# Altium footprint library SMotlaq-PCB_lib.PcbLib: 186 footprints (part 7 of 12)
Each footprint in its own frame and in the unit in brackets; x right, y up, seen from the top. Pads: shape width x height; smd on the part's side, far side on the other; paste and mask are expansions set on the pad; w line width, h text height; cw(c..) or ccw(c..) is an arc to the next point about the centre after c.
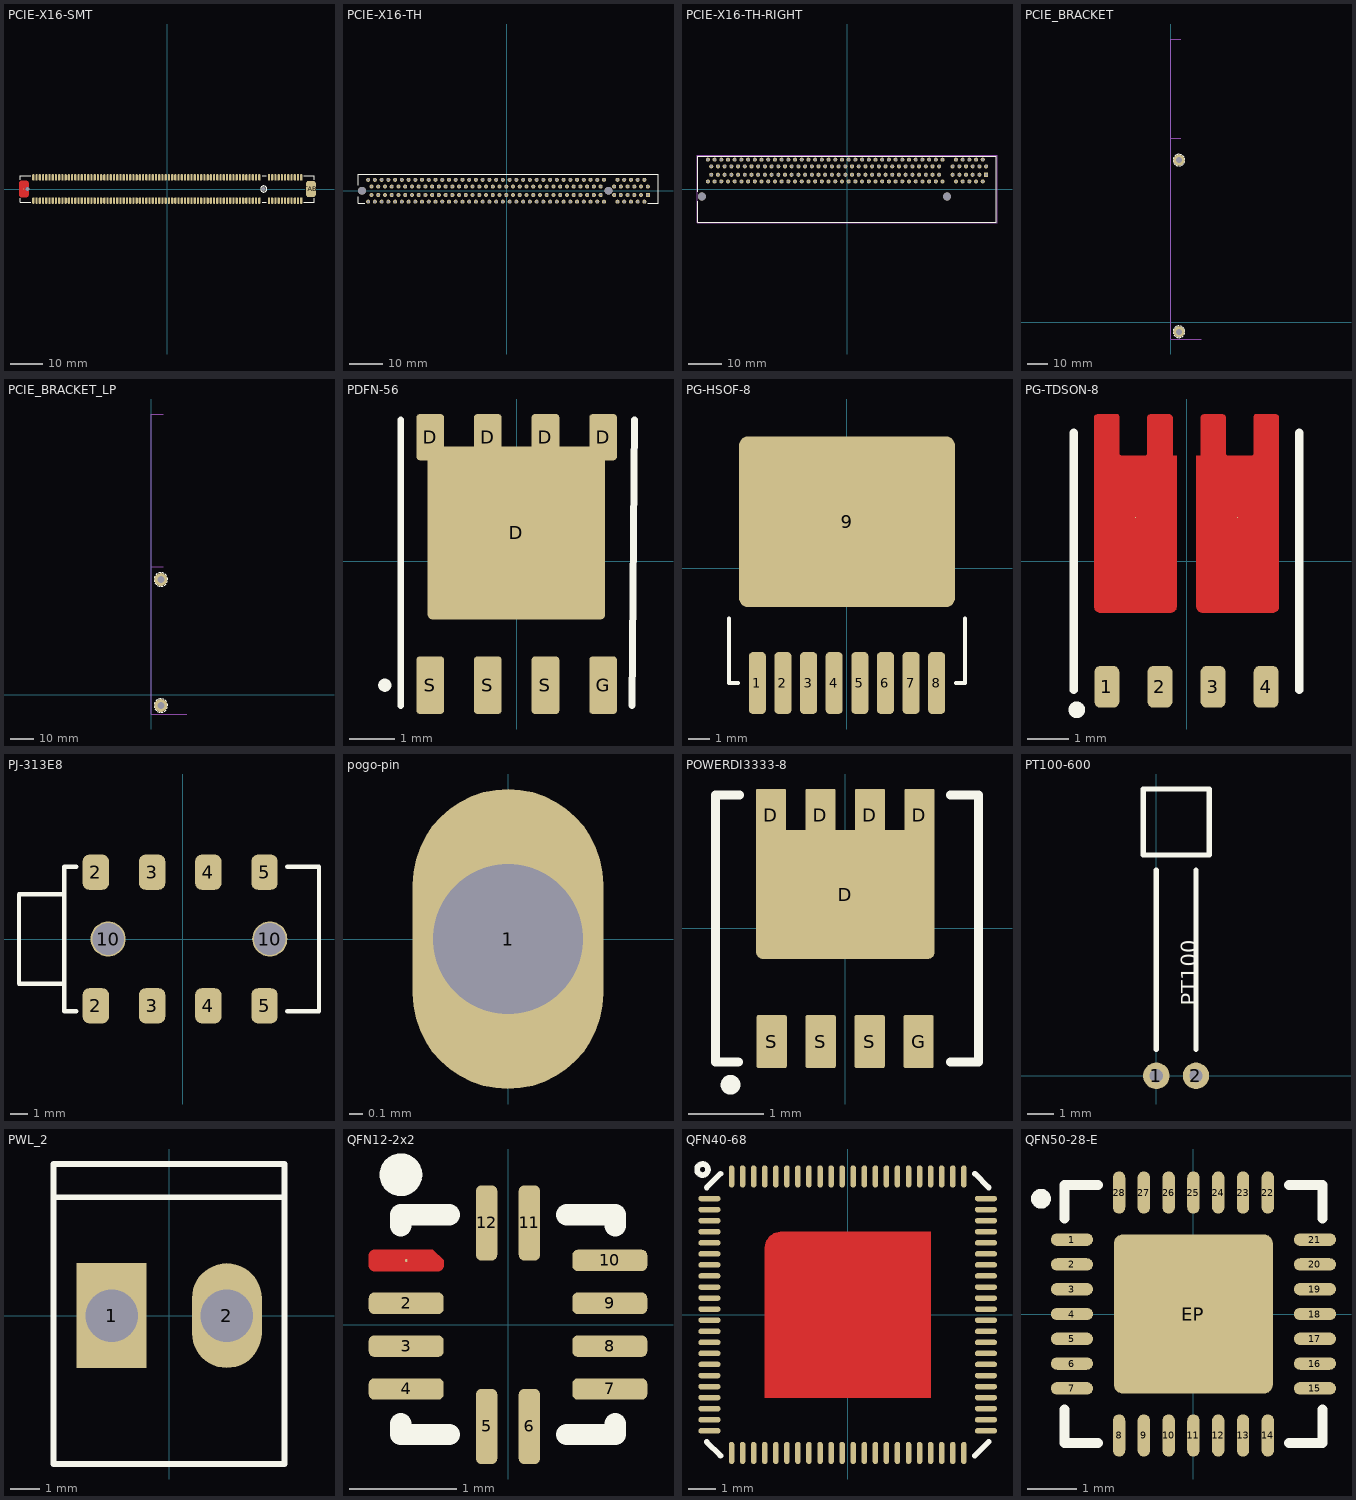
[diagram p6: the footprints below, top view; thin cyan lines are the x and y axes]

## PCIE-X16-SMT [mm]
pads (168):
  rrect80% 0.7x2 smd mask+0.075: A1(41.475,-3.6) A2(40.475,-3.6) A3(39.475,-3.6) A4(38.475,-3.6) A5(37.475,-3.6) A6(36.475,-3.6) A7(35.475,-3.6) A8(34.475,-3.6) A9(33.475,-3.6) A10(32.475,-3.6) A11(31.475,-3.6) A12(28.475,-3.6) A13(27.475,-3.6) A14(26.475,-3.6) A15(25.475,-3.6) A16(24.475,-3.6) A17(23.475,-3.6) A18(22.475,-3.6) A19(21.475,-3.6) A20(20.475,-3.6) A21(19.475,-3.6) A22(18.475,-3.6) A23(17.475,-3.6) A24(16.475,-3.6) A25(15.475,-3.6) A26(14.475,-3.6) A27(13.475,-3.6) A28(12.475,-3.6) A29(11.475,-3.6) A30(10.475,-3.6) A31(9.475,-3.6) A32(8.475,-3.6) A33(7.475,-3.6) A34(6.475,-3.6) A35(5.475,-3.6) A36(4.475,-3.6) A37(3.475,-3.6) A38(2.475,-3.6) A39(1.475,-3.6) A40(0.475,-3.6) A41(-0.525,-3.6) A42(-1.525,-3.6) A43(-2.525,-3.6) A44(-3.525,-3.6) A45(-4.525,-3.6) A46(-5.525,-3.6) A47(-6.525,-3.6) A48(-7.525,-3.6) A49(-8.525,-3.6) A50(-9.525,-3.6) A51(-10.525,-3.6) A52(-11.525,-3.6) A53(-12.525,-3.6) A54(-13.525,-3.6) A55(-14.525,-3.6) A56(-15.525,-3.6) A57(-16.525,-3.6) A58(-17.525,-3.6) A59(-18.525,-3.6) A60(-19.525,-3.6) A61(-20.525,-3.6) A62(-21.525,-3.6) A63(-22.525,-3.6) A64(-23.525,-3.6) A65(-24.525,-3.6) A66(-25.525,-3.6) A67(-26.525,-3.6) A68(-27.525,-3.6) A69(-28.525,-3.6) A70(-29.525,-3.6) A71(-30.525,-3.6) A72(-31.525,-3.6) A73(-32.525,-3.6) A74(-33.525,-3.6) A75(-34.525,-3.6) A76(-35.525,-3.6) A77(-36.525,-3.6) A78(-37.525,-3.6) A79(-38.525,-3.6) A80(-39.525,-3.6) A81(-40.525,-3.6) A82(-41.525,-3.6) B1(41.475,3.6) B2(40.475,3.6) B3(39.475,3.6) B4(38.475,3.6) B5(37.475,3.6) B6(36.475,3.6) B7(35.475,3.6) B8(34.475,3.6) B9(33.475,3.6) B10(32.475,3.6) B11(31.475,3.6) B12(28.475,3.6) B13(27.475,3.6) B14(26.475,3.6) B15(25.475,3.6) B16(24.475,3.6) B17(23.475,3.6) B18(22.475,3.6) B19(21.475,3.6) B20(20.475,3.6) B21(19.475,3.6) B22(18.475,3.6) B23(17.475,3.6) B24(16.475,3.6) B25(15.475,3.6) B26(14.475,3.6) B27(13.475,3.6) B28(12.475,3.6) B29(11.475,3.6) B30(10.475,3.6) B31(9.475,3.6) B32(8.475,3.6) B33(7.475,3.6) B34(6.475,3.6) B35(5.475,3.6) B36(4.475,3.6) B37(3.475,3.6) B38(2.475,3.6) B39(1.475,3.6) B40(0.475,3.6) B41(-0.525,3.6) B42(-1.525,3.6) B43(-2.525,3.6) B44(-3.525,3.6) B45(-4.525,3.6) B46(-5.525,3.6) B47(-6.525,3.6) B48(-7.525,3.6) B49(-8.525,3.6) B50(-9.525,3.6) B51(-10.525,3.6) B52(-11.525,3.6) B53(-12.525,3.6) B54(-13.525,3.6) B55(-14.525,3.6) B56(-15.525,3.6) B57(-16.525,3.6) B58(-17.525,3.6) B59(-18.525,3.6) B60(-19.525,3.6) B61(-20.525,3.6) B62(-21.525,3.6) B63(-22.525,3.6) B64(-23.525,3.6) B65(-24.525,3.6) B66(-25.525,3.6) B67(-26.525,3.6) B68(-27.525,3.6) B69(-28.525,3.6) B70(-29.525,3.6) B71(-30.525,3.6) B72(-31.525,3.6) B73(-32.525,3.6) B74(-33.525,3.6) B75(-34.525,3.6) B76(-35.525,3.6) B77(-36.525,3.6) B78(-37.525,3.6) B79(-38.525,3.6) B80(-39.525,3.6) B81(-40.525,3.6) B82(-41.525,3.6)
  rrect100% 0x0 hole 1.2 unplated mask+0.075: PIN(-43.325,0) PIN(29.825,0)
  round 0.025 smd mask+0.075: TAB(-44.475,0)
  rrect50% 3x5 smd mask+0.075: TAB(44.475,0)
Top Layer:
  region: -45.975,1.75 -45.975,-1.75 -45.975,-1.799 -45.962,-1.897 -45.937,-1.992 -45.899,-2.082 -45.85,-2.168 -45.79,-2.246 -45.721,-2.315 -45.643,-2.375 -45.557,-2.424 -45.467,-2.462 -45.372,-2.487 -45.274,-2.5 -45.225,-2.5 -43.725,-2.5 -43.676,-2.5 -43.578,-2.487 -43.483,-2.462 -43.393,-2.424 -43.307,-2.375 -43.229,-2.315 -43.16,-2.246 -43.1,-2.168 -43.051,-2.082 -43.013,-1.992 -42.988,-1.897 -42.975,-1.799 -42.975,-1.75 -42.975,-0.725 -43.375,-0.725 -43.419,-0.724 -43.507,-0.712 -43.592,-0.689 -43.674,-0.655 -43.75,-0.611 -43.82,-0.557 -43.882,-0.495 -43.936,-0.425 -43.98,-0.349 -44.014,-0.267 -44.037,-0.182 -44.049,-0.094 -44.05,-0.05 -44.05,0.025 -44.048,0.071 -44.037,0.162 -44.013,0.25 -43.978,0.335 -43.932,0.414 -43.876,0.487 -43.812,0.551 -43.739,0.607 -43.66,0.653 -43.575,0.688 -43.487,0.712 -43.396,0.723 -43.35,0.725 -42.975,0.725 -42.975,1.75 -42.975,1.799 -42.988,1.897 -43.013,1.992 -43.051,2.082 -43.1,2.168 -43.16,2.246 -43.229,2.315 -43.307,2.375 -43.393,2.424 -43.483,2.462 -43.578,2.487 -43.676,2.5 -43.725,2.5 -44.375,2.5 -45.225,2.5 -45.274,2.5 -45.372,2.487 -45.467,2.462 -45.557,2.424 -45.643,2.375 -45.721,2.315 -45.79,2.246 -45.85,2.168 -45.899,2.082 -45.937,1.992 -45.962,1.897 -45.975,1.799
Top Overlay:
  circle w0.2: c29.825,0 r0.941
  lines w0.2: -45.55,-2.85 -45.55,-4.1 -42.375,-4.1 ; -45.55,2.85 -45.55,4.1 -42.375,4.1 ; 29.325,-4.1 30.575,-4.1 ; 29.325,4.1 30.575,4.1 ; 42.325,-4.1 45.5,-4.1 45.5,-2.85 ; 42.325,4.1 45.5,4.1 45.5,2.85
3D body "User Library-G630HAA2621EU.STEP": height 10.91, standoff -0.69, extent -45.499,-4.475 45.5,4.475

## PCIE-X16-TH [mm]
pads (166):
  rect 1.208x1.208 hole 0.7: A1(41.8,-1.25)
  round 1.208 hole 0.7: A2(40.8,-3.25) A3(39.8,-1.25) A4(38.8,-3.25) A5(37.8,-1.25) A6(36.8,-3.25) A7(35.8,-1.25) A8(34.8,-3.25) A9(33.8,-1.25) A10(32.8,-3.25) A11(31.8,-1.25) A12(28.8,-3.25) A13(27.8,-1.25) A14(26.8,-3.25) A15(25.8,-1.25) A16(24.8,-3.25) A17(23.8,-1.25) A18(22.8,-3.25) A19(21.8,-1.25) A20(20.8,-3.25) A21(19.8,-1.25) A22(18.8,-3.25) A23(17.8,-1.25) A24(16.8,-3.25) A25(15.8,-1.25) A26(14.8,-3.25) A27(13.8,-1.25) A28(12.8,-3.25) A29(11.8,-1.25) A30(10.8,-3.25) A31(9.8,-1.25) A32(8.8,-3.25) A33(7.8,-1.25) A34(6.8,-3.25) A35(5.8,-1.25) A36(4.8,-3.25) A37(3.8,-1.25) A38(2.8,-3.25) A39(1.8,-1.25) A40(0.8,-3.25) A41(-0.2,-1.25) A42(-1.2,-3.25) A43(-2.2,-1.25) A44(-3.2,-3.25) A45(-4.2,-1.25) A46(-5.2,-3.25) A47(-6.2,-1.25) A48(-7.2,-3.25) A49(-8.2,-1.25) A50(-9.2,-3.25) A51(-10.2,-1.25) A52(-11.2,-3.25) A53(-12.2,-1.25) A54(-13.2,-3.25) A55(-14.2,-1.25) A56(-15.2,-3.25) A57(-16.2,-1.25) A58(-17.2,-3.25) A59(-18.2,-1.25) A60(-19.2,-3.25) A61(-20.2,-1.25) A62(-21.2,-3.25) A63(-22.2,-1.25) A64(-23.2,-3.25) A65(-24.2,-1.25) A66(-25.2,-3.25) A67(-26.2,-1.25) A68(-27.2,-3.25) A69(-28.2,-1.25) A70(-29.2,-3.25) A71(-30.2,-1.25) A72(-31.2,-3.25) A73(-32.2,-1.25) A74(-33.2,-3.25) A75(-34.2,-1.25) A76(-35.2,-3.25) A77(-36.2,-1.25) A78(-37.2,-3.25) A79(-38.2,-1.25) A80(-39.2,-3.25) A81(-40.2,-1.25) A82(-41.2,-3.25) B1(41.8,1.25) B2(40.8,3.25) B3(39.8,1.25) B4(38.8,3.25) B5(37.8,1.25) B6(36.8,3.25) B7(35.8,1.25) B8(34.8,3.25) B9(33.8,1.25) B10(32.8,3.25) B11(31.8,1.25) B12(28.8,3.25) B13(27.8,1.25) B14(26.8,3.25) B15(25.8,1.25) B16(24.8,3.25) B17(23.8,1.25) B18(22.8,3.25) B19(21.8,1.25) B20(20.8,3.25) B21(19.8,1.25) B22(18.8,3.25) B23(17.8,1.25) B24(16.8,3.25) B25(15.8,1.25) B26(14.8,3.25) B27(13.8,1.25) B28(12.8,3.25) B29(11.8,1.25) B30(10.8,3.25) B31(9.8,1.25) B32(8.8,3.25) B33(7.8,1.25) B34(6.8,3.25) B35(5.8,1.25) B36(4.8,3.25) B37(3.8,1.25) B38(2.8,3.25) B39(1.8,1.25) B40(0.8,3.25) B41(-0.2,1.25) B42(-1.2,3.25) B43(-2.2,1.25) B44(-3.2,3.25) B45(-4.2,1.25) B46(-5.2,3.25) B47(-6.2,1.25) B48(-7.2,3.25) B49(-8.2,1.25) B50(-9.2,3.25) B51(-10.2,1.25) B52(-11.2,3.25) B53(-12.2,1.25) B54(-13.2,3.25) B55(-14.2,1.25) B56(-15.2,3.25) B57(-16.2,1.25) B58(-17.2,3.25) B59(-18.2,1.25) B60(-19.2,3.25) B61(-20.2,1.25) B62(-21.2,3.25) B63(-22.2,1.25) B64(-23.2,3.25) B65(-24.2,1.25) B66(-25.2,3.25) B67(-26.2,1.25) B68(-27.2,3.25) B69(-28.2,1.25) B70(-29.2,3.25) B71(-30.2,1.25) B72(-31.2,3.25) B73(-32.2,1.25) B74(-33.2,3.25) B75(-34.2,1.25) B76(-35.2,3.25) B77(-36.2,1.25) B78(-37.2,3.25) B79(-38.2,1.25) B80(-39.2,3.25) B81(-40.2,1.25) B82(-41.2,3.25)
  round 2.35 hole 2.35 unplated: ""(-43,0) ""(30.15,0)
Top Overlay:
  lines w0.2: -44.2,-1.8 -44.2,-3.71 -42.25,-3.71 ; -44.2,1.6 -44.2,4.9 44.825,4.9 44.825,-3.71 41.85,-3.71
3D body "pcie-164-02-f-d-th.stp": height 10.2, standoff -5.38, extent -44.202,-3.708 44.8,4.902

## PCIE-X16-TH-RIGHT [mm]
pads (166):
  rect 1.208x1.208 hole 0.7: A1(41.5,4.25)
  round 1.208 hole 0.7: A2(40.5,2.25) A3(39.5,4.25) A4(38.5,2.25) A5(37.5,4.25) A6(36.5,2.25) A7(35.5,4.25) A8(34.5,2.25) A9(33.5,4.25) A10(32.5,2.25) A11(31.5,4.25) A12(28.5,2.25) A13(27.5,4.25) A14(26.5,2.25) A15(25.5,4.25) A16(24.5,2.25) A17(23.5,4.25) A18(22.5,2.25) A19(21.5,4.25) A20(20.5,2.25) A21(19.5,4.25) A22(18.5,2.25) A23(17.5,4.25) A24(16.5,2.25) A25(15.5,4.25) A26(14.5,2.25) A27(13.5,4.25) A28(12.5,2.25) A29(11.5,4.25) A30(10.5,2.25) A31(9.5,4.25) A32(8.5,2.25) A33(7.5,4.25) A34(6.5,2.25) A35(5.5,4.25) A36(4.5,2.25) A37(3.5,4.25) A38(2.5,2.25) A39(1.5,4.25) A40(0.5,2.25) A41(-0.5,4.25) A42(-1.5,2.25) A43(-2.5,4.25) A44(-3.5,2.25) A45(-4.5,4.25) A46(-5.5,2.25) A47(-6.5,4.25) A48(-7.5,2.25) A49(-8.5,4.25) A50(-9.5,2.25) A51(-10.5,4.25) A52(-11.5,2.25) A53(-12.5,4.25) A54(-13.5,2.25) A55(-14.5,4.25) A56(-15.5,2.25) A57(-16.5,4.25) A58(-17.5,2.25) A59(-18.5,4.25) A60(-19.5,2.25) A61(-20.5,4.25) A62(-21.5,2.25) A63(-22.5,4.25) A64(-23.5,2.25) A65(-24.5,4.25) A66(-25.5,2.25) A67(-26.5,4.25) A68(-27.5,2.25) A69(-28.5,4.25) A70(-29.5,2.25) A71(-30.5,4.25) A72(-31.5,2.25) A73(-32.5,4.25) A74(-33.5,2.25) A75(-34.5,4.25) A76(-35.5,2.25) A77(-36.5,4.25) A78(-37.5,2.25) A79(-38.5,4.25) A80(-39.5,2.25) A81(-40.5,4.25) A82(-41.5,2.25) B1(41.5,6.75) B2(40.5,8.75) B3(39.5,6.75) B4(38.5,8.75) B5(37.5,6.75) B6(36.5,8.75) B7(35.5,6.75) B8(34.5,8.75) B9(33.5,6.75) B10(32.5,8.75) B11(31.5,6.75) B12(28.5,8.75) B13(27.5,6.75) B14(26.5,8.75) B15(25.5,6.75) B16(24.5,8.75) B17(23.5,6.75) B18(22.5,8.75) B19(21.5,6.75) B20(20.5,8.75) B21(19.5,6.75) B22(18.5,8.75) B23(17.5,6.75) B24(16.5,8.75) B25(15.5,6.75) B26(14.5,8.75) B27(13.5,6.75) B28(12.5,8.75) B29(11.5,6.75) B30(10.5,8.75) B31(9.5,6.75) B32(8.5,8.75) B33(7.5,6.75) B34(6.5,8.75) B35(5.5,6.75) B36(4.5,8.75) B37(3.5,6.75) B38(2.5,8.75) B39(1.5,6.75) B40(0.5,8.75) B41(-0.5,6.75) B42(-1.5,8.75) B43(-2.5,6.75) B44(-3.5,8.75) B45(-4.5,6.75) B46(-5.5,8.75) B47(-6.5,6.75) B48(-7.5,8.75) B49(-8.5,6.75) B50(-9.5,8.75) B51(-10.5,6.75) B52(-11.5,8.75) B53(-12.5,6.75) B54(-13.5,8.75) B55(-14.5,6.75) B56(-15.5,8.75) B57(-16.5,6.75) B58(-17.5,8.75) B59(-18.5,6.75) B60(-19.5,8.75) B61(-20.5,6.75) B62(-21.5,8.75) B63(-22.5,6.75) B64(-23.5,8.75) B65(-24.5,6.75) B66(-25.5,8.75) B67(-26.5,6.75) B68(-27.5,8.75) B69(-28.5,6.75) B70(-29.5,8.75) B71(-30.5,6.75) B72(-31.5,8.75) B73(-32.5,6.75) B74(-33.5,8.75) B75(-34.5,6.75) B76(-35.5,8.75) B77(-36.5,6.75) B78(-37.5,8.75) B79(-38.5,6.75) B80(-39.5,8.75) B81(-40.5,6.75) B82(-41.5,8.75)
  round 2.35 hole 2.35 unplated: ""(-43.3,-2.25) ""(29.85,-2.25)
Top Overlay:
  lines w0.2: -44.5,-3.65 -44.5,-9.95 44.5,-9.95 44.5,9.8 -44.5,9.8 -44.5,-0.75
Mechanical 15:
  lines w0.05: -44.75,-10.05 -44.75,10.05 44.75,10.05 44.75,-10.05 -44.75,-10.05
3D body "pcie-164-02-f-d-ra.stp": height 9.45, standoff -4.4, extent -44.5,-9.975 44.5,9.075

## PCIE_BRACKET [mm] "PC IO BOARD BRACKET"
pads (2):
  round 5.5 hole 3: MH1(4,-4.7)
  round 5.5 hole 3 mask+0.075: MH2(4,80.7)
Top Overlay:
  lines w0.2: 1.1,-4.7 ccw(c4,-4.7) 1.275,-5.692 ; 1.1,80.7 ccw(c4,80.7) 1.275,79.708 ; 1.144,-4.196 cw(c4,-4.7) 1.489,-3.25 ; 1.144,81.204 cw(c4,80.7) 1.489,82.15 ; 1.489,-6.15 ccw(c4,-4.7) 2.136,-6.922 ; 1.489,79.25 ccw(c4,80.7) 2.136,78.478 ; 1.778,-2.836 cw(c4,-4.7) 2.55,-2.189 ; 1.778,82.564 cw(c4,80.7) 2.55,83.211 ; 2.55,-7.211 ccw(c4,-4.7) 3.496,-7.556 ; 2.55,78.189 ccw(c4,80.7) 3.496,77.844 ; 3.008,-1.975 cw(c4,-4.7) 4,-1.8 ; 3.008,83.425 cw(c4,80.7) 4,83.6 ; 4,-7.6 ccw(c4,-4.7) 4.992,-7.425 ; 4,77.8 ccw(c4,80.7) 4.992,77.975 ; 4.504,-1.844 cw(c4,-4.7) 5.45,-2.189 ; 4.504,83.556 cw(c4,80.7) 5.45,83.211 ; 5.45,-7.211 ccw(c4,-4.7) 6.222,-6.564 ; 5.45,78.189 ccw(c4,80.7) 6.222,78.836 ; 5.864,-2.478 cw(c4,-4.7) 6.511,-3.25 ; 5.864,82.922 cw(c4,80.7) 6.511,82.15 ; 6.511,-6.15 ccw(c4,-4.7) 6.856,-5.204 ; 6.511,79.25 ccw(c4,80.7) 6.856,80.196 ; 6.725,-3.708 cw(c4,-4.7) 6.9,-4.7 ; 6.725,81.692 cw(c4,80.7) 6.9,80.7
Mechanical 1:
  lines w0.1: 0,91.7 5,91.7 ; 5,141 0,141 0,-8.3 15,-8.3
3D body "User Library-pci bracket-1.step": height 16.91, standoff -4.68, extent -16.852,-29.305 7.151,91.705

## PCIE_BRACKET_LP [mm] "PC IO BOARD BRACKET"
pads (2):
  round 5.5 hole 3: MH1(4,-4.7) MH2(4,49.2)
Top Overlay:
  lines w0.2: 1.1,-4.7 ccw(c4,-4.7) 1.275,-5.692 ; 1.1,49.2 ccw(c4,49.2) 1.275,48.208 ; 1.144,-4.196 cw(c4,-4.7) 1.489,-3.25 ; 1.144,49.704 cw(c4,49.2) 1.489,50.65 ; 1.489,-6.15 ccw(c4,-4.7) 2.136,-6.922 ; 1.489,47.75 ccw(c4,49.2) 2.136,46.978 ; 1.778,-2.836 cw(c4,-4.7) 2.55,-2.189 ; 1.778,51.064 cw(c4,49.2) 2.55,51.711 ; 2.55,-7.211 ccw(c4,-4.7) 3.496,-7.556 ; 2.55,46.688 ccw(c4,49.2) 3.496,46.344 ; 3.008,-1.975 cw(c4,-4.7) 4,-1.8 ; 3.008,51.925 cw(c4,49.2) 4,52.1 ; 4,-7.6 ccw(c4,-4.7) 4.992,-7.425 ; 4,46.3 ccw(c4,49.2) 4.992,46.475 ; 4.504,-1.844 cw(c4,-4.7) 5.45,-2.189 ; 4.504,52.056 cw(c4,49.2) 5.45,51.711 ; 5.45,-7.211 ccw(c4,-4.7) 6.222,-6.564 ; 5.45,46.688 ccw(c4,49.2) 6.222,47.336 ; 5.864,-2.478 cw(c4,-4.7) 6.511,-3.25 ; 5.864,51.421 cw(c4,49.2) 6.511,50.65 ; 6.511,-6.15 ccw(c4,-4.7) 6.856,-5.204 ; 6.511,47.75 ccw(c4,49.2) 6.856,48.696 ; 6.725,-3.708 cw(c4,-4.7) 6.9,-4.7 ; 6.725,50.192 cw(c4,49.2) 6.9,49.2
Mechanical 1:
  lines w0.1: 0,54.6 5,54.6 ; 5,120 0,120 0,-8.3 15,-8.3
3D body "User Library-Low Profile Bracket.step": height 20, standoff -3, extent -17.04,-25.7 9.1,54.587

## PDFN-56 [mm]
pads (9):
  rrect25% 0.61x1.02 smd: D(-1.905,2.733) D(-0.635,2.733) D(0.635,2.733) D(1.905,2.733)
  rrect5% 3.91x3.81 smd: D(-0.005,0.623)
  rrect25% 0.61x1.27 smd: G(1.905,-2.732) S(-1.905,-2.732) S(-0.635,-2.732) S(0.635,-2.732)
Top Overlay:
  circle w0.15: c-2.905,-2.732 r0.071
  lines w0.15: -2.555,-3.182 -2.555,3.118 ; 2.545,-3.182 2.595,3.118
3D body "PDFN56.STEP": height 1.22, standoff -0.03, extent -2.555,-3.193 2.545,3.127

## PG-HSOF-8 [mm]
pads (24):
  rrect50% 0.8x2.9 smd mask+0.075: 1(-4.2,-5.375) 2(-3,-5.375) 3(-1.8,-5.375) 4(-0.6,-5.375) 5(0.6,-5.375) 6(1.8,-5.375) 7(3,-5.375) 8(4.2,-5.375)
  rrect10% 10.1x8 smd paste-2539.97 mask+0.075: 9(0,2.175)
  rrect20% 2.5x1 on Top Paste mask+0.075: ""(-3.1,-1.025) ""(-3.1,0.575) ""(-3.1,5.375) ""(0,-1.025) ""(0,0.575) ""(0,2.175) ""(0,3.775) ""(0,5.375) ""(3.1,-1.025) ""(3.1,0.575) ""(3.1,5.375)
  rrect20% 2x1 on Top Paste mask+0.075: ""(-2.85,2.175) ""(-2.85,3.775) ""(2.85,2.175) ""(2.85,3.775)
Top Overlay:
  lines w0.2: -5.525,-2.35 -5.525,-5.375 -5.1,-5.375 ; 5.1,-5.375 5.525,-5.375 5.525,-2.35
3D body "BTS500051LUAAUMA1.stp": height 2.3, standoff -0.02, extent -4.9,-6.027 4.9,5.445

## PG-TDSON-8 [mm]
pads (18):
  rrect50% 0.6x1 smd paste-2539.97 mask+0.1: 1(-1.905,-3) 2(-0.635,-3) 3(0.635,-3) 4(1.905,-3)
  round 0.025 smd paste-2539.97 mask+0.1: 5(1.22,1.05) 6(-1.22,1.05)
  rrect50% 0.5x0.9 on Top Paste mask+0.1: ""(-1.905,-3) ""(-1.905,3) ""(-0.635,-3) ""(-0.635,3) ""(0.635,-3) ""(0.635,3) ""(1.905,-3) ""(1.905,3)
  rrect10% 1.4x1.5 on Top Paste mask+0.1: ""(-1.22,-0.2) ""(-1.22,1.5) ""(1.22,-0.2) ""(1.22,1.5)
Top Layer:
  region: -2.205,-1.095 -2.205,3.445 -2.205,3.461 -2.193,3.49 -2.17,3.513 -2.141,3.525 -2.125,3.525 -1.675,3.525 -1.661,3.525 -1.635,3.514 -1.616,3.495 -1.605,3.469 -1.605,3.455 -1.605,2.585 -1.604,2.574 -1.595,2.552 -1.578,2.535 -1.556,2.526 -1.545,2.525 -1,2.525 -0.987,2.526 -0.964,2.536 -0.946,2.554 -0.936,2.577 -0.935,2.59 -0.935,3.44 -0.935,3.457 -0.922,3.488 -0.898,3.512 -0.867,3.525 -0.85,3.525 -0.425,3.525 -0.407,3.525 -0.374,3.511 -0.349,3.486 -0.335,3.453 -0.335,3.435 -0.335,2.525 -0.235,2.525 -0.235,-1.085 -0.235,-1.099 -0.24,-1.126 -0.251,-1.151 -0.266,-1.174 -0.286,-1.194 -0.309,-1.209 -0.334,-1.22 -0.361,-1.225 -0.375,-1.225 -2.075,-1.225 -2.088,-1.225 -2.113,-1.22 -2.137,-1.21 -2.158,-1.196 -2.176,-1.178 -2.19,-1.157 -2.2,-1.133 -2.205,-1.108
  region: 2.205,-1.095 2.205,3.445 2.205,3.461 2.193,3.49 2.17,3.513 2.141,3.525 2.125,3.525 1.675,3.525 1.661,3.525 1.635,3.514 1.616,3.495 1.605,3.469 1.605,3.455 1.605,2.585 1.604,2.574 1.595,2.552 1.578,2.535 1.556,2.526 1.545,2.525 1,2.525 0.987,2.526 0.964,2.536 0.946,2.554 0.936,2.577 0.935,2.59 0.935,3.44 0.935,3.457 0.922,3.488 0.898,3.512 0.867,3.525 0.85,3.525 0.425,3.525 0.407,3.525 0.374,3.511 0.349,3.486 0.335,3.453 0.335,3.435 0.335,2.525 0.235,2.525 0.235,-1.085 0.235,-1.099 0.24,-1.126 0.251,-1.151 0.266,-1.174 0.286,-1.194 0.309,-1.209 0.334,-1.22 0.361,-1.225 0.375,-1.225 2.075,-1.225 2.088,-1.225 2.113,-1.22 2.137,-1.21 2.158,-1.196 2.176,-1.178 2.19,-1.157 2.2,-1.133 2.205,-1.108
Top Overlay:
  circle w0.2: c-2.625,-3.55 r0.1
  lines w0.2: -2.7,-3.075 -2.7,3.075 ; 2.7,-3.075 2.7,3.075
3D body "Infineon-PG-TDSON-8-4_3D_01_STP-Package-v05_00-EN.stp": height 1.01, standoff 0, extent -2.695,-3.075 2.695,3.075

## PJ-313E8 [mm]
pads (10):
  rrect50% 1.5x2 smd: 2(-4.95,-3.8) 2(-4.95,3.8) 3(-1.75,-3.8) 3(-1.75,3.8) 4(1.45,-3.8) 4(1.45,3.8) 5(4.65,-3.8) 5(4.65,3.8)
  round 2 hole 1.8: 10(-4.25,0) 10(4.95,0)
Top Overlay:
  lines w0.254: -6.75,-2.55 -9.325,-2.55 -9.325,0 -9.325,2.55 -6.75,2.55 ; -6.075,-4.1 -6.75,-4.1 -6.75,4.1 -6.075,4.1 ; 5.95,-4.1 7.75,-4.1 7.75,4.1 5.95,4.1
3D body "pj-313e8-g-smt.stp": height 5.3, standoff -0.6, extent -9.35,-4.1 7.75,4.1

## pogo-pin [mm]
pads (1):
  oval 1.4x2.2 hole 1.1: 1(0,0)
3D body "User Library-PL75-B1.step": height 9.4, standoff -25, extent -0.5,-0.5 0.5,0.5

## POWERDI3333-8 [mm]
height 0.8
pads (9):
  rrect10% 0.4x0.7 smd: D(-0.985,1.501) D(-0.328,1.501) D(0.328,1.501) D(0.985,1.501) G(0.975,-1.5) S(-0.975,-1.5) S(-0.325,-1.5) S(0.325,-1.5)
  rrect10% 2.37x1.71 smd: D(0.003,0.451)
Top Overlay:
  circle w0.15: c-1.522,-2.074 r0.056
  lines w0.12: -1.419,-1.771 -1.722,-1.77 -1.722,1.769 -1.4,1.769 ; 1.4,-1.77 1.77,-1.77 1.77,1.77 1.4,1.769
Top Solder:
  region: 1.185,1.85 1.185,1.309 0.765,1.309 0.765,1.85
  region: 0.535,1.85 0.535,1.31 0.115,1.309 0.115,1.85
  region: -0.115,1.85 -0.115,1.309 -0.535,1.309 -0.535,1.85
  region: -0.765,1.85 -0.765,1.31 -1.185,1.309 -1.185,1.85
3D body "POWERDI3333-8_UX_DIO.step": height 0.84, standoff 0, extent -1.701,-1.724 1.703,1.68

## PT100-600 [mm]
pads (2):
  round 1 hole 0.5: 1(0,0) 2(1.5,0)
Top Overlay:
  lines w0.2: 0,1 0,7.775 ; 1.5,1 1.5,7.775 ; -0.5,8.35 2,8.35 2,10.85 -0.5,10.85 -0.5,8.35
  text "PT100" at 1.744,2.651 h1
3D body "PT100-600.STEP": height 0.77, standoff -1.08, extent -0.5,-0.1 2,10.851

## PWL_2 [mm] "Connector; Header; 2 Position"
height 0.001
pads (2):
  rect 2.4x3.6 hole 1.8: 1(-1.98,0)
  oval 2.4x3.6 hole 1.8: 2(1.98,0)
Top Overlay:
  lines w0.2: -3.98,4.064 3.96,4.064 ; -3.98,-5.1 -3.98,5.207 3.96,5.207 3.96,-5.1 -3.98,-5.1
3D body "PWL-2.stp": height 13.5, standoff -4, extent -3.96,-5 3.96,5

## QFN12-2x2 [mm]
pads (12):
  round 0.025 smd mask+0.075: 1(-0.95,0.6)
  rrect50% 0.7x0.2 smd mask+0.075: 2(-0.95,0.2) 3(-0.95,-0.2) 4(-0.95,-0.6) 7(0.95,-0.6) 8(0.95,-0.2) 9(0.95,0.2) 10(0.95,0.6)
  rrect50% 0.2x0.7 smd mask+0.075: 5(-0.2,-0.95) 6(0.2,-0.95) 11(0.2,0.95) 12(-0.2,0.95)
Top Layer:
  region: -1.3,0.55 -1.3,0.65 -1.3,0.66 -1.292,0.678 -1.278,0.692 -1.26,0.7 -1.25,0.7 -0.7,0.7 -0.6,0.6 -0.6,0.55 -0.6,0.54 -0.608,0.522 -0.622,0.508 -0.64,0.5 -0.65,0.5 -1.25,0.5 -1.26,0.5 -1.278,0.508 -1.292,0.522 -1.3,0.54
Top Overlay:
  circle w0.2: c-1,1.4 r0.1
  lines w0.2: -1,-0.925 -1,-1.025 -0.55,-1.025 ; -1,0.925 -1,1.025 -0.55,1.025 ; 0.55,-1.025 1,-1.025 1,-0.925 ; 0.55,1.025 1,1.025 1,0.925
3D body "User Library-W-QFN2020-12.step": height 0.8, standoff 0, extent -1,-1.025 1.05,1.025

## QFN40-68 [mm]
pads (89):
  oval 0.8x0.2 smd mask+0.05: 1(-5,4.2) 2(-5,3.8) 3(-5,3.4) 4(-5,3) 5(-5,2.6) 6(-5,2.2) 7(-5,1.8) 8(-5,1.4) 9(-5,1) 10(-5,0.6) 11(-5,0.2) 12(-5,-0.2) 13(-5,-0.6) 14(-5,-1) 15(-5,-1.4) 16(-5,-1.8) 17(-5,-2.2) 18(-5,-2.6) 19(-5,-3) 20(-5,-3.4) 21(-5,-3.8) 22(-5,-4.2) 45(5,-4.2) 46(5,-3.8) 47(5,-3.4) 48(5,-3) 49(5,-2.6) 50(5,-2.2) 51(5,-1.8) 52(5,-1.4) 53(5,-1) 54(5,-0.6) 55(5,-0.2) 56(5,0.2) 57(5,0.6) 58(5,1) 59(5,1.4) 60(5,1.8) 61(5,2.2) 62(5,2.6) 63(5,3) 64(5,3.4) 65(5,3.8) 66(5,4.2)
  oval 0.2x0.8 smd mask+0.05: 23(-4.2,-5) 24(-3.8,-5) 25(-3.4,-5) 26(-3,-5) 27(-2.6,-5) 28(-2.2,-5) 29(-1.8,-5) 30(-1.4,-5) 31(-1,-5) 32(-0.6,-5) 33(-0.2,-5) 34(0.2,-5) 35(0.6,-5) 36(1,-5) 37(1.4,-5) 38(1.8,-5) 39(2.2,-5) 40(2.6,-5) 41(3,-5) 42(3.4,-5) 43(3.8,-5) 44(4.2,-5) 67(4.2,5) 68(3.8,5) 69(3.4,5) 70(3,5) 71(2.6,5) 72(2.2,5) 73(1.8,5) 74(1.4,5) 75(1,5) 76(0.6,5) 77(0.2,5) 78(-0.2,5) 79(-0.6,5) 80(-1,5) 81(-1.4,5) 82(-1.8,5) 83(-2.2,5) 84(-2.6,5) 85(-3,5) 86(-3.4,5) 87(-3.8,5) 88(-4.2,5)
  round 0.025 smd paste-5: 89(0,0)
Top Layer:
  region: 3,-3 -3,-3 -3,2.4 -3,2.439 -2.99,2.517 -2.969,2.593 -2.939,2.666 -2.9,2.734 -2.852,2.796 -2.796,2.852 -2.734,2.9 -2.666,2.939 -2.593,2.969 -2.517,2.99 -2.439,3 -2.4,3 3,3
Top Overlay:
  circle w0.2: c-5.25,5.25 r0.2
  lines w0.2: -5.1,-4.6 -4.6,-5.1 ; -5.1,4.6 -4.6,5.1 ; 4.6,-5.1 5.1,-4.6 ; 4.6,5.1 5.1,4.6
Top Paste:
  region: 1.2,1.2 0.2,1.2 0.2,0.2 1.2,0.2
  region: 2.6,2.6 1.6,2.6 1.6,1.6 2.6,1.6
  rectangle: 0.2,1.6 1.2,2.6
  region: 2.6,1.2 1.6,1.2 1.6,0.2 2.6,0.2
  rectangle: -2.6,0.2 -1.6,1.2
  region: -0.2,2.6 -1.2,2.6 -1.2,1.6 -0.2,1.6
  rectangle: -2.6,1.6 -1.6,2.6
  rectangle: -1.2,0.2 -0.2,1.2
  rectangle: -1.2,-1.2 -0.2,-0.2
  rectangle: -2.6,-2.6 -1.6,-1.6
  region: -0.2,-1.6 -1.2,-1.6 -1.2,-2.6 -0.2,-2.6
  rectangle: -2.6,-1.2 -1.6,-0.2
  region: 2.6,-0.2 1.6,-0.2 1.6,-1.2 2.6,-1.2
  rectangle: 0.2,-2.6 1.2,-1.6
  region: 2.6,-1.6 1.6,-1.6 1.6,-2.6 2.6,-2.6
  region: 1.2,-0.2 0.2,-0.2 0.2,-1.2 1.2,-1.2
3D body "User Library-QFN-88-1EP_10X10_Pitch0_4mm.x_t": height 0.81, standoff -0.04, extent -5,-5 5,5

## QFN50-28-E [mm]
pads (29):
  oval 0.85x0.25 smd mask+0.075: 1(-2.45,1.5) 2(-2.45,1) 3(-2.45,0.5) 4(-2.45,0) 5(-2.45,-0.5) 6(-2.45,-1) 7(-2.45,-1.5) 15(2.45,-1.5) 16(2.45,-1) 17(2.45,-0.5) 18(2.45,0) 19(2.45,0.5) 20(2.45,1) 21(2.45,1.5)
  oval 0.25x0.85 smd mask+0.075: 8(-1.5,-2.45) 9(-1,-2.45) 10(-0.5,-2.45) 11(0,-2.45) 12(0.5,-2.45) 13(1,-2.45) 14(1.5,-2.45) 22(1.5,2.45) 23(1,2.45) 24(0.5,2.45) 25(0,2.45) 26(-0.5,2.45) 27(-1,2.45) 28(-1.5,2.45)
  rrect10% 3.2x3.2 smd paste-3 mask+0.075: EP(0,0)
Top Overlay:
  circle w0.2: c-3.075,2.325 r0.1
  lines w0.2: -2.6,-1.925 -2.6,-2.6 -1.925,-2.6 ; -2.6,1.925 -2.6,2.6 -1.925,2.6 ; 1.925,-2.6 2.6,-2.6 2.6,-1.925 ; 1.925,2.6 2.6,2.6 2.6,1.925
Top Paste:
  rectangle: -1.4,-1.4 -0.2,-0.2
  region: 1.4,-0.2 0.2,-0.2 0.2,-1.4 1.4,-1.4
  region: 1.4,1.4 0.2,1.4 0.2,0.2 1.4,0.2
  rectangle: -1.4,0.2 -0.2,1.4
3D body "QFN50_28TT.step": height 1, standoff 0, extent -2.501,-2.501 2.501,2.501